# Altium footprint library Footprints.PcbLib: 135 footprints (part 2 of 9)
Each footprint in its own frame and in the unit in brackets; x right, y up, seen from the top. Pads: shape width x height; smd on the part's side, far side on the other; paste and mask are expansions set on the pad; w line width, h text height; cw(c..) or ccw(c..) is an arc to the next point about the centre after c.
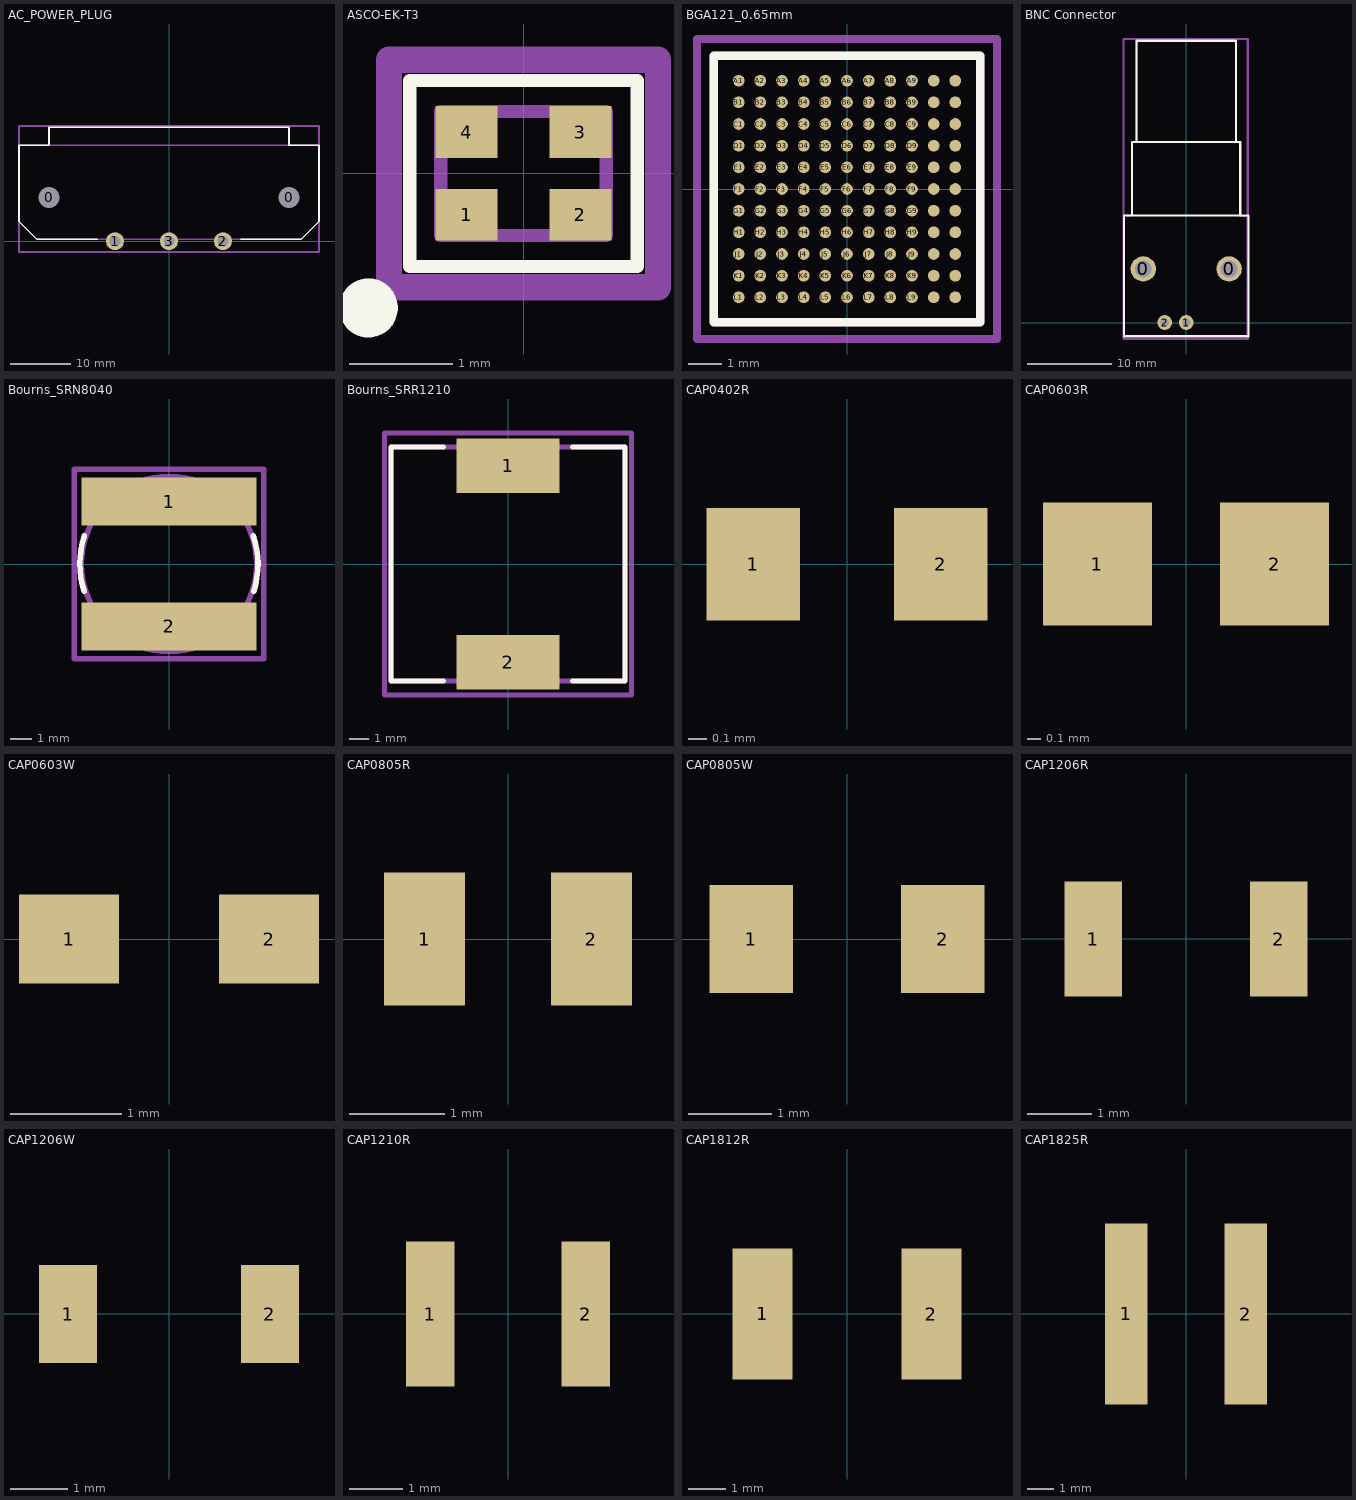
[diagram p1: the footprints below, top view; thin cyan lines are the x and y axes]

## AC_POWER_PLUG [mm]
height 26
pads (5):
  round 3 hole 3.5 mask+0.102: 0(-20,7.3) 0(20,7.3)
  round 3 hole 1.8 mask+0.102: 1(-9,0) 2(9,0) 3(0,0)
Top Overlay:
  lines w0.254: -12,0.3 -22,0.3 -25,3.3 -25,16 -20,16 -20,19 20,19 20,16 25,16 25,3.3 22,0.3 12,0.3
Mechanical 13:
  lines w0.254: -20,16 -20,19 20,19 20,16 ; -25,3.3 -22,0.3 22,0.3 25,3.3 25,16 -25,16 -25,3.3
Mechanical 15:
  lines w0.254: -25,-1.8 -25,19.2 25,19.2 25,-1.8 -25,-1.8
3D body: height 23.3, standoff 3.5, extent -20,16 20,19
3D body: height 25, standoff 0, extent -25,14 25,16
3D body: height 3.5, standoff 0, extent -25,0.3 25,16
3D body: height 25, standoff 0, extent -13.5,1.5 13.5,16
3D body: height 20, standoff -3.5, extent -0.5,-0.5 0.5,0.5
3D body: height 20, standoff -3.5, extent 8.5,-0.5 9.5,0.5
3D body: height 20, standoff -3.5, extent -9.5,-0.6 -8.5,0.6

## ASCO-EK-T3 [mm]
height 0.6
pads (4):
  rect 0.6x0.5 smd: 1(-0.55,-0.4) 2(0.55,-0.4) 3(0.55,0.4) 4(-0.55,0.4)
Top Overlay:
  circle w0.37: c-1.5,-1.3 r0.1
  lines w0.127: -1.1,-0.9 1.1,-0.9 1.1,0.9 -1.1,0.9 -1.1,-0.9
Mechanical 13:
  lines w0.127: -0.8,-0.6 -0.8,0.6 0.8,0.6 0.8,-0.6 -0.8,-0.6
Mechanical 15:
  lines w0.254: -1.3,-1.1 1.3,-1.1 1.3,1.1 -1.3,1.1 -1.3,-1.1
3D body: height 0.6, standoff 0, extent -0.8,-0.6 0.8,0.6
3D body: height 0.7, standoff 0.6, extent -0.7,-0.5 0.7,0.5

## BGA121_0.65mm [mm]
height 1.5
pads (121):
  round 0.35 smd: A1(-3.25,3.25) A2(-2.6,3.25) A3(-1.95,3.25) A4(-1.3,3.25) A5(-0.65,3.25) A6(0,3.25) A7(0.65,3.25) A8(1.3,3.25) A9(1.95,3.25) A10(2.6,3.25) A11(3.25,3.25) B1(-3.25,2.6) B2(-2.6,2.6) B3(-1.95,2.6) B4(-1.3,2.6) B5(-0.65,2.6) B6(0,2.6) B7(0.65,2.6) B8(1.3,2.6) B9(1.95,2.6) B10(2.6,2.6) B11(3.25,2.6) C1(-3.25,1.95) C2(-2.6,1.95) C3(-1.95,1.95) C4(-1.3,1.95) C5(-0.65,1.95) C6(0,1.95) C7(0.65,1.95) C8(1.3,1.95) C9(1.95,1.95) C10(2.6,1.95) C11(3.25,1.95) D1(-3.25,1.3) D2(-2.6,1.3) D3(-1.95,1.3) D4(-1.3,1.3) D5(-0.65,1.3) D6(0,1.3) D7(0.65,1.3) D8(1.3,1.3) D9(1.95,1.3) D10(2.6,1.3) D11(3.25,1.3) E1(-3.25,0.65) E2(-2.6,0.65) E3(-1.95,0.65) E4(-1.3,0.65) E5(-0.65,0.65) E6(0,0.65) E7(0.65,0.65) E8(1.3,0.65) E9(1.95,0.65) E10(2.6,0.65) E11(3.25,0.65) F1(-3.25,0) F2(-2.6,0) F3(-1.95,0) F4(-1.3,0) F5(-0.65,0) F6(0,0) F7(0.65,0) F8(1.3,0) F9(1.95,0) F10(2.6,0) F11(3.25,0) G1(-3.25,-0.65) G2(-2.6,-0.65) G3(-1.95,-0.65) G4(-1.3,-0.65) G5(-0.65,-0.65) G6(0,-0.65) G7(0.65,-0.65) G8(1.3,-0.65) G9(1.95,-0.65) G10(2.6,-0.65) G11(3.25,-0.65) H1(-3.25,-1.3) H2(-2.6,-1.3) H3(-1.95,-1.3) H4(-1.3,-1.3) H5(-0.65,-1.3) H6(0,-1.3) H7(0.65,-1.3) H8(1.3,-1.3) H9(1.95,-1.3) H10(2.6,-1.3) H11(3.25,-1.3) J1(-3.25,-1.95) J2(-2.6,-1.95) J3(-1.95,-1.95) J4(-1.3,-1.95) J5(-0.65,-1.95) J6(0,-1.95) J7(0.65,-1.95) J8(1.3,-1.95) J9(1.95,-1.95) J10(2.6,-1.95) J11(3.25,-1.95) K1(-3.25,-2.6) K2(-2.6,-2.6) K3(-1.95,-2.6) K4(-1.3,-2.6) K5(-0.65,-2.6) K6(0,-2.6) K7(0.65,-2.6) K8(1.3,-2.6) K9(1.95,-2.6) K10(2.6,-2.6) K11(3.25,-2.6) L1(-3.25,-3.25) L2(-2.6,-3.25) L3(-1.95,-3.25) L4(-1.3,-3.25) L5(-0.65,-3.25) L6(0,-3.25) L7(0.65,-3.25) L8(1.3,-3.25) L9(1.95,-3.25) L10(2.6,-3.25) L11(3.25,-3.25)
Top Overlay:
  lines w0.254: -4,-4 -4,4 4,4 4,-4 -4,-4
Mechanical 13:
  lines w0.254: -4,-4 -4,4 4,4 4,-4 -4,-4
Mechanical 15:
  lines w0.254: -4.5,-4.5 -4.5,4.5 4.5,4.5 4.5,-4.5 -4.5,-4.5
3D body: height 1.43, standoff 0, extent -4,-4 4,4

## BNC Connector [mm]
height 13
pads (4):
  round 3 hole 2 mask+0.102: 0(-5.08,6.35) 0(5.08,6.35)
  round 1.75 hole 1 mask+0.102: 1(0,0) 2(-2.54,0)
Top Overlay:
  lines w0.254: -6.4,12.65 -6.4,21.35 6.4,21.35 6.4,12.65 ; -5.9,21.35 -5.9,33.35 5.9,33.35 5.9,21.35 ; -7.35,-1.625 -7.35,12.65 7.35,12.65 7.35,-1.625 -7.35,-1.625
Mechanical 13:
  lines w0.254: 5.875,33.325 5.875,21.35 6.375,21.35 6.375,12.625 7.325,12.625 7.325,-1.6 -7.35,-1.6 -7.35,12.65 -6.4,12.65 -6.4,21.35 -5.9,21.35 -5.9,33.35 5.9,33.35
Mechanical 15:
  lines w0.254: -7.4,-1.95 -7.4,33.55 7.275,33.55 7.275,-1.95 -7.4,-1.95
3D body: height 13.31, standoff -4.15, extent -7.4,-1.95 7.3,33.55

## Bourns_SRN8040 [mm]
height 4
pads (2):
  rect 8x2.2 smd mask+0.102: 1(0,2.85) 2(0,-2.85)
Top Overlay:
  lines w0.254: -3.875,-1.25 cw(c0,0) -3.863,1.288 ; 3.855,1.285 cw(c0,0) 3.868,-1.248
Mechanical 13:
  circle w0.254: c0,0 r4
Mechanical 15:
  lines w0.254: -4.318,-4.318 -4.318,4.318 4.318,4.318 4.318,-4.318 -4.318,-4.318
3D body: height 4, standoff 0, extent -3.968,-3.992 4,3.992

## Bourns_SRR1210 [mm] "SMD Inductor, 1210 package"
height 10
pads (2):
  rect 5.3x2.8 smd mask+0.102: 1(0,5.05) 2(0,-5.05)
Top Overlay:
  lines w0.254: -3.3,-6 -6,-6 -6,6 -3.3,6 ; 3.3,-6 6,-6 6,6 3.3,6
Mechanical 13:
  lines w0.254: -6,-6 -6,6 6,6 6,-6 -6,-6
Mechanical 15:
  lines w0.254: -6.35,-6.731 6.35,-6.731 6.35,6.731 -6.35,6.731 -6.35,-6.731
3D body: height 10, standoff 0, extent -5.969,-5.969 5.969,5.969

## CAP0402R [mm] "Capacitor 0402 reflow soldering"
pads (2):
  rect 0.5x0.6 smd: 1(-0.5,0) 2(0.5,0)
3D body: height 0.2, standoff 0, extent -0.5,-0.3 0.5,0.3

## CAP0603R [mm] "capacitor 0603 reflow soldering"
pads (2):
  rect 0.8x0.9 smd: 1(-0.65,0) 2(0.65,0)
3D body: height 0.3, standoff 0, extent -0.8,-0.4 0.8,0.4

## CAP0603W [mm] "capacitor 0603 wave soldering"
pads (2):
  rect 0.9x0.8 smd: 1(-0.9,0) 2(0.9,0)
3D body: height 0.3, standoff 0, extent -0.8,-0.4 0.8,0.4

## CAP0805R [mm] "capacitor 0805 reflow soldering"
pads (2):
  rect 0.85x1.4 smd: 1(-0.875,0) 2(0.875,0)
3D body: height 0.78, standoff 0, extent -1,-0.625 1,0.625

## CAP0805W [mm] "capacitor 0805 wave soldering"
pads (2):
  rect 1x1.3 smd: 1(-1.15,0) 2(1.15,0)
3D body: height 0.78, standoff 0, extent -1,-0.625 1,0.625

## CAP1206R [mm] "capacitor 1206 reflow soldering"
pads (2):
  rect 0.9x1.8 smd: 1(-1.45,0) 2(1.45,0)
3D body: height 1, standoff 0, extent -1.6,-0.8 1.6,0.8

## CAP1206W [mm] "capacitor 1206 wave soldering"
pads (2):
  rect 1x1.7 smd: 1(-1.75,0) 2(1.75,0)
3D body: height 1, standoff 0, extent -1.6,-0.8 1.6,0.8

## CAP1210R [mm] "capacitor 1210 reflow soldering"
pads (2):
  rect 0.9x2.7 smd: 1(-1.45,0) 2(1.45,0)
3D body: height 0.92, standoff -0.02, extent -1.6,-1.25 1.6,1.25

## CAP1812R [mm] "capacitor 1812 reflow soldering"
pads (2):
  rect 1.6x3.5 smd: 1(-2.25,0) 2(2.25,0)
3D body: height 1.6, standoff 0, extent -2.25,-1.6 2.25,1.6

## CAP1825R [mm] "capacitor 1825 reflow soldering"
pads (2):
  rect 1.6x6.8 smd: 1(-2.25,0) 2(2.25,0)
3D body: height 1.22, standoff -0.02, extent -2.25,-3.2 2.25,3.2